# Altium footprint library SMDLibrary.PcbLib: 309 footprints (part 7 of 20)
Each footprint in its own frame and in the unit in brackets; x right, y up, seen from the top. Pads: shape width x height; smd on the part's side, far side on the other; paste and mask are expansions set on the pad; w line width, h text height; cw(c..) or ccw(c..) is an arc to the next point about the centre after c.
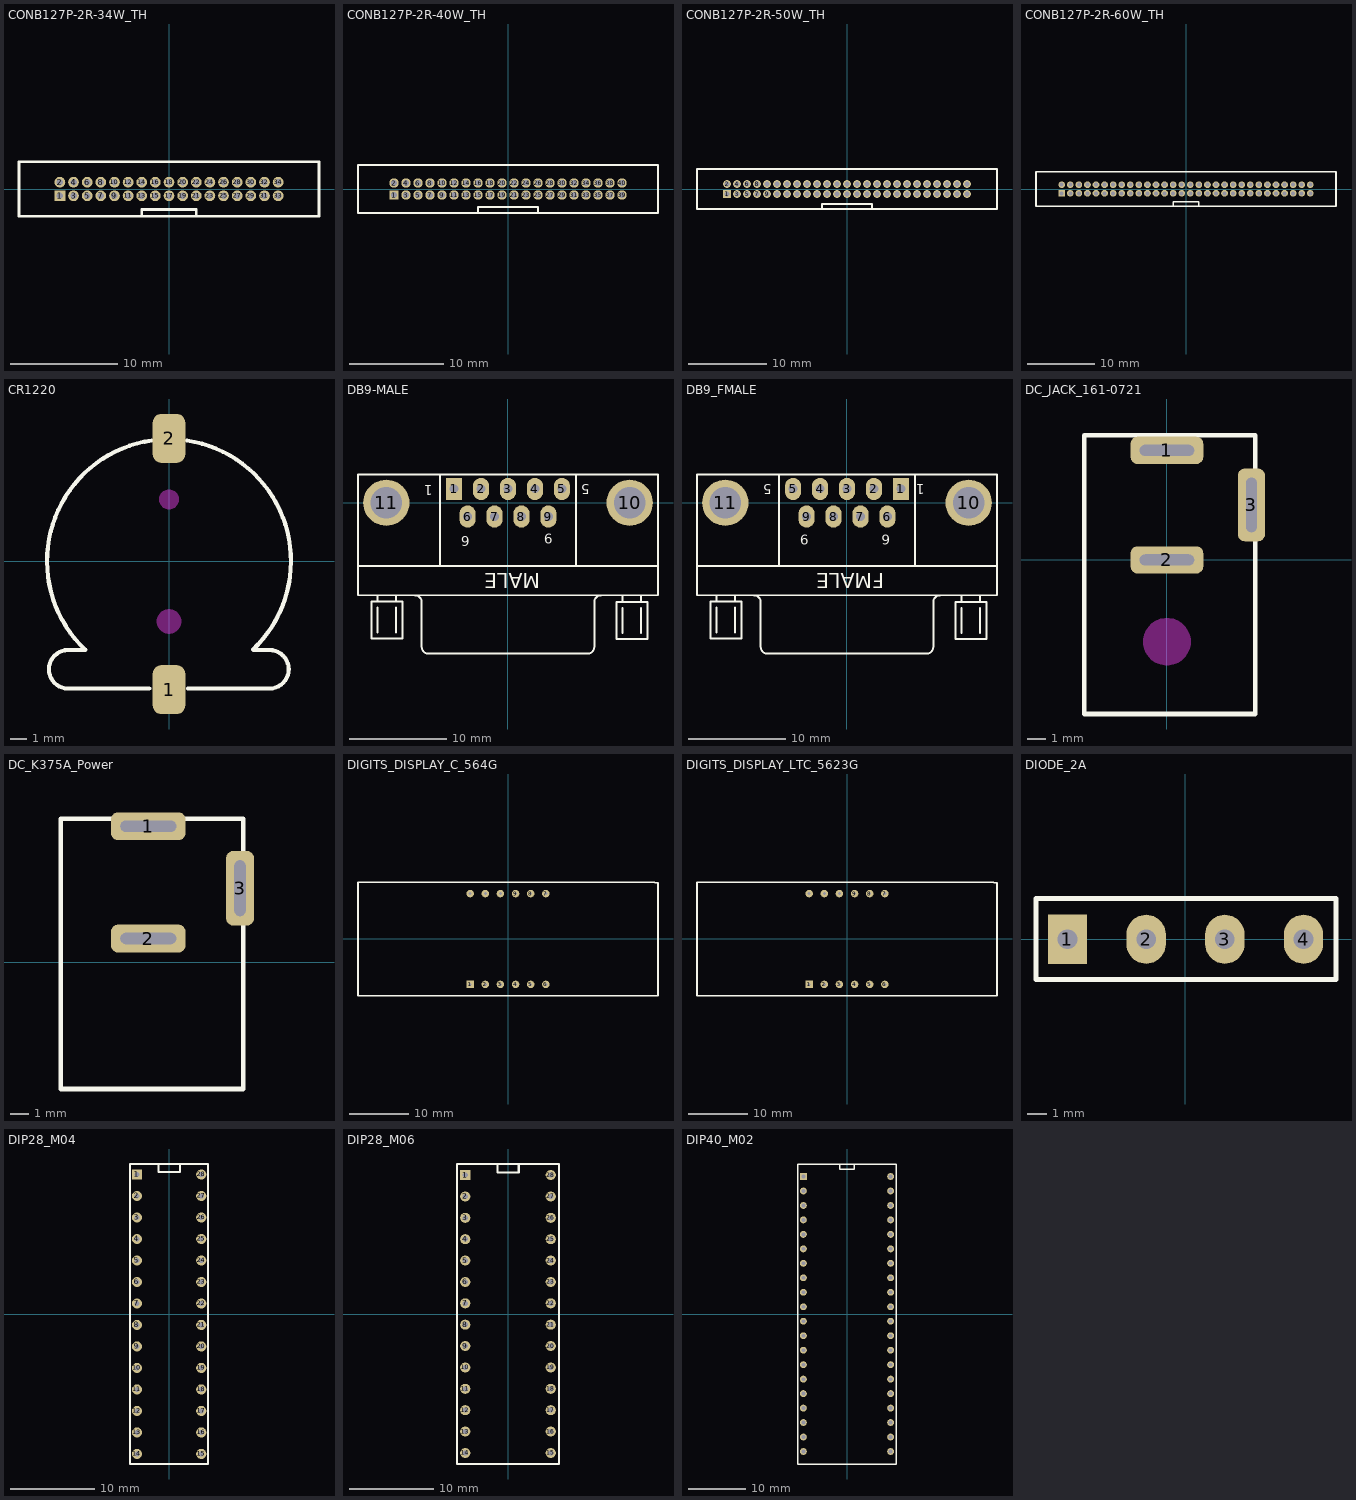
[diagram p6: the footprints below, top view; thin cyan lines are the x and y axes]

## CONB127P-2R-34W_TH [mm]
pads (34):
  rect 1x1 hole 0.6: 1(-10.16,-0.635)
  round 1 hole 0.6: 2(-10.16,0.635) 3(-8.89,-0.635) 4(-8.89,0.635) 5(-7.62,-0.635) 6(-7.62,0.635) 7(-6.35,-0.635) 8(-6.35,0.635) 9(-5.08,-0.635) 10(-5.08,0.635) 11(-3.81,-0.635) 12(-3.81,0.635) 13(-2.54,-0.635) 14(-2.54,0.635) 15(-1.27,-0.635) 16(-1.27,0.635) 17(0,-0.635) 18(0,0.635) 19(1.27,-0.635) 20(1.27,0.635) 21(2.54,-0.635) 22(2.54,0.635) 23(3.81,-0.635) 24(3.81,0.635) 25(5.08,-0.635) 26(5.08,0.635) 27(6.35,-0.635) 28(6.35,0.635) 29(7.62,-0.635) 30(7.62,0.635) 31(8.89,-0.635) 32(8.89,0.635) 33(10.16,-0.635) 34(10.16,0.635)
Top Overlay:
  lines w0.254: -2.54,-2.54 -2.54,-1.905 2.54,-1.905 2.54,-2.54 ; -13.97,-2.54 13.97,-2.54 13.97,2.54 -13.97,2.54 -13.97,-2.54
3D body "CONB127P-2R-34W_TH.STEP": height 5.4, standoff -2.1, extent -13.945,-2.65 13.945,2.55

## CONB127P-2R-40W_TH [mm]
pads (40):
  rect 1x1 hole 0.6: 1(-12.065,-0.635)
  round 1 hole 0.6: 2(-12.065,0.635) 3(-10.795,-0.635) 4(-10.795,0.635) 5(-9.525,-0.635) 6(-9.525,0.635) 7(-8.255,-0.635) 8(-8.255,0.635) 9(-6.985,-0.635) 10(-6.985,0.635) 11(-5.715,-0.635) 12(-5.715,0.635) 13(-4.445,-0.635) 14(-4.445,0.635) 15(-3.175,-0.635) 16(-3.175,0.635) 17(-1.905,-0.635) 18(-1.905,0.635) 19(-0.635,-0.635) 20(-0.635,0.635) 21(0.635,-0.635) 22(0.635,0.635) 23(1.905,-0.635) 24(1.905,0.635) 25(3.175,-0.635) 26(3.175,0.635) 27(4.445,-0.635) 28(4.445,0.635) 29(5.715,-0.635) 30(5.715,0.635) 31(6.985,-0.635) 32(6.985,0.635) 33(8.255,-0.635) 34(8.255,0.635) 35(9.525,-0.635) 36(9.525,0.635) 37(10.795,-0.635) 38(10.795,0.635) 39(12.065,-0.635) 40(12.065,0.635)
Top Overlay:
  lines w0.254: -3.175,-2.54 -3.175,-1.905 3.175,-1.905 3.175,-2.54 ; -15.875,-2.54 -15.875,2.54 15.875,2.54 15.875,-2.54 -15.875,-2.54
3D body "CONB127P-2R-40W_TH.STEP": height 5.4, standoff -2.1, extent -15.85,-2.65 15.85,2.55

## CONB127P-2R-50W_TH [mm]
pads (50):
  rect 1x1 hole 0.6: 1(-15.24,-0.635)
  round 1 hole 0.6: 2(-15.24,0.635) 3(-13.97,-0.635) 4(-13.97,0.635) 5(-12.7,-0.635) 6(-12.7,0.635) 7(-11.43,-0.635) 8(-11.43,0.635) 9(-10.16,-0.635) 10(-10.16,0.635) 11(-8.89,-0.635) 12(-8.89,0.635) 13(-7.62,-0.635) 14(-7.62,0.635) 15(-6.35,-0.635) 16(-6.35,0.635) 17(-5.08,-0.635) 18(-5.08,0.635) 19(-3.81,-0.635) 20(-3.81,0.635) 21(-2.54,-0.635) 22(-2.54,0.635) 23(-1.27,-0.635) 24(-1.27,0.635) 25(0,-0.635) 26(0,0.635) 27(1.27,-0.635) 28(1.27,0.635) 29(2.54,-0.635) 30(2.54,0.635) 31(3.81,-0.635) 32(3.81,0.635) 33(5.08,-0.635) 34(5.08,0.635) 35(6.35,-0.635) 36(6.35,0.635) 37(7.62,-0.635) 38(7.62,0.635) 39(8.89,-0.635) 40(8.89,0.635) 41(10.16,-0.635) 42(10.16,0.635) 43(11.43,-0.635) 44(11.43,0.635) 45(12.7,-0.635) 46(12.7,0.635) 47(13.97,-0.635) 48(13.97,0.635) 49(15.24,-0.635) 50(15.24,0.635)
Top Overlay:
  lines w0.254: -3.175,-2.54 -3.175,-1.905 3.175,-1.905 3.175,-2.54 ; -19.05,-2.54 -19.05,2.54 19.05,2.54 19.05,-2.54 -19.05,-2.54
3D body "CONB127P-2R-50W_TH.STEP": height 5.4, standoff -2.1, extent -19.025,-2.65 19.025,2.55

## CONB127P-2R-60W_TH [mm]
pads (60):
  rect 1x1 hole 0.6: 1(-18.415,-0.635)
  round 1 hole 0.6: 2(-18.415,0.635) 3(-17.145,-0.635) 4(-17.145,0.635) 5(-15.875,-0.635) 6(-15.875,0.635) 7(-14.605,-0.635) 8(-14.605,0.635) 9(-13.335,-0.635) 10(-13.335,0.635) 11(-12.065,-0.635) 12(-12.065,0.635) 13(-10.795,-0.635) 14(-10.795,0.635) 15(-9.525,-0.635) 16(-9.525,0.635) 17(-8.255,-0.635) 18(-8.255,0.635) 19(-6.985,-0.635) 20(-6.985,0.635) 21(-5.715,-0.635) 22(-5.715,0.635) 23(-4.445,-0.635) 24(-4.445,0.635) 25(-3.175,-0.635) 26(-3.175,0.635) 27(-1.905,-0.635) 28(-1.905,0.635) 29(-0.635,-0.635) 30(-0.635,0.635) 31(0.635,-0.635) 32(0.635,0.635) 33(1.905,-0.635) 34(1.905,0.635) 35(3.175,-0.635) 36(3.175,0.635) 37(4.445,-0.635) 38(4.445,0.635) 39(5.715,-0.635) 40(5.715,0.635) 41(6.985,-0.635) 42(6.985,0.635) 43(8.255,-0.635) 44(8.255,0.635) 45(9.525,-0.635) 46(9.525,0.635) 47(10.795,-0.635) 48(10.795,0.635) 49(12.065,-0.635) 50(12.065,0.635) 51(13.335,-0.635) 52(13.335,0.635) 53(14.605,-0.635) 54(14.605,0.635) 55(15.875,-0.635) 56(15.875,0.635) 57(17.145,-0.635) 58(17.145,0.635) 59(18.415,-0.635) 60(18.415,0.635)
Top Overlay:
  lines w0.254: -1.905,-2.54 -1.905,-1.905 1.905,-1.905 1.905,-2.54 ; -22.225,-2.54 -22.225,2.54 22.225,2.54 22.225,-2.54 -22.225,-2.54
3D body "CONB127P-2R-60W_TH.STEP": height 5.4, standoff -2.1, extent -22.2,-2.65 22.2,2.55

## CR1220 [mm]
pads (2):
  rrect50% 2x3 smd: 1(0,-7.9) 2(0,7.55)
Top Overlay:
  lines w0.254: -5.161,-5.463 -6.2,-5.463 ccw(c-6.2,-6.65) -6.2,-7.837 -1.213,-7.837 ; -5.15,-5.452 cw(c0,0) -1.057,7.425 ; 1.111,7.417 cw(c0,0) 5.164,-5.439 ; 1.162,-7.837 6.175,-7.837 ccw(c6.175,-6.65) 6.175,-5.463 5.187,-5.463
Keep-Out Layer:
  board cut-out: 0,3.2 -0.119,3.2 -0.34,3.291 -0.509,3.46 -0.6,3.681 -0.6,3.8 -0.6,3.919 -0.509,4.14 -0.34,4.309 -0.119,4.4 0,4.4 0.119,4.4 0.34,4.309 0.509,4.14 0.6,3.919 0.6,3.8 0.6,3.681 0.509,3.46 0.34,3.291 0.119,3.2
  board cut-out: -0.75,-3.7 -0.75,-3.774 -0.721,-3.919 -0.665,-4.055 -0.583,-4.178 -0.478,-4.283 -0.355,-4.365 -0.219,-4.421 -0.074,-4.45 0,-4.45 0.074,-4.45 0.219,-4.421 0.355,-4.365 0.478,-4.283 0.583,-4.178 0.665,-4.055 0.721,-3.919 0.75,-3.774 0.75,-3.7 0.75,-3.626 0.721,-3.481 0.665,-3.345 0.583,-3.222 0.478,-3.117 0.355,-3.035 0.219,-2.979 0.074,-2.95 0,-2.95 -0.074,-2.95 -0.219,-2.979 -0.355,-3.035 -0.478,-3.117 -0.583,-3.222 -0.665,-3.345 -0.721,-3.481 -0.75,-3.626
3D body "User Library-cr1220.STEP": height 4.04, standoff -0.9, extent -7.5,-9.425 7.497,9.075

## DB9-MALE [mil]
pads (11):
  rect 65x90 hole 35: 1(-218.11,55.91)
  oval 65x90 hole 35: 2(-109.05,55.91) 3(0,55.91) 4(109.06,55.91) 5(218.11,55.91) 6(-163.58,-55.91) 7(-54.53,-55.91) 8(54.53,-55.91) 9(163.58,-55.91)
  round 187.4 hole 128.35: 10(491.93,0) 11(-491.93,0)
Top Overlay:
  lines w7.87: -606.3,-255.91 606.3,-255.91 ; -376.38,-374.21 cw(c-376.38,-401.57) -349.02,-401.57 -349.02,-582.68 ; -348.82,-582.87 ccw(c-321.46,-582.87) -321.46,-610.24 321.46,-610.24 ccw(c321.46,-582.87) 348.82,-582.87 ; -275.59,-255.91 -275.59,114.17 ; 275.59,-255.91 275.59,114.17 ; 349.02,-582.68 349.02,-401.57 cw(c376.38,-401.57) 376.38,-374.21 ; -606.3,-374.02 -606.3,114.17 606.3,114.17 606.3,-374.02 -606.3,-374.02
  lines w8: -527,-524.02 -527,-424.02 ; -527,-399.02 -527,-374.02 ; -452,-524.02 -452,-424.02 ; -452,-399.02 -452,-374.02 ; 463,-526.02 463,-426.02 ; 463,-401.02 463,-376.02 ; 538,-526.02 538,-426.02 ; 538,-401.02 538,-376.02 ; -552,-549.02 -552,-399.02 -427,-399.02 -427,-549.02 -552,-549.02 ; 438,-551.02 438,-401.02 563,-401.02 563,-551.02 438,-551.02
  text "MALE" at 130,-285 h60
  text "1" at -305,70 h40
  text "5" at 330,75 h40
  text "9" at 180,-125 h40
  text "6" at -155,-135 h40
3D body "SW3dPS-9-PIN_DSUB.STEP": height 494.6, standoff -124.4, extent -610,-637 606,138

## DB9_FMALE [mil]
pads (11):
  rect 65x90 hole 35: 1(218.11,55.91)
  oval 65x90 hole 35: 2(109.06,55.91) 3(0,55.91) 4(-109.05,55.91) 5(-218.11,55.91) 6(163.58,-55.91) 7(54.53,-55.91) 8(-54.53,-55.91) 9(-163.58,-55.91)
  round 187.4 hole 128.35: 10(491.93,0) 11(-491.93,0)
Top Overlay:
  lines w7.87: -606.3,-255.91 606.3,-255.91 ; -376.38,-374.21 cw(c-376.38,-401.57) -349.02,-401.57 -349.02,-582.68 ; -348.82,-582.87 ccw(c-321.46,-582.87) -321.46,-610.24 321.46,-610.24 ccw(c321.46,-582.87) 348.82,-582.87 ; -275.59,-255.91 -275.59,114.17 ; 275.59,-255.91 275.59,114.17 ; 349.02,-582.68 349.02,-401.57 cw(c376.38,-401.57) 376.38,-374.21 ; -606.3,-374.02 606.3,-374.02 606.3,114.17 -606.3,114.17 -606.3,-374.02
  lines w8: -527,-524.02 -527,-424.02 ; -527,-399.02 -527,-374.02 ; -452,-524.02 -452,-424.02 ; -452,-399.02 -452,-374.02 ; 463,-526.02 463,-426.02 ; 463,-401.02 463,-376.02 ; 538,-526.02 538,-426.02 ; 538,-401.02 538,-376.02 ; -552,-549.02 -427,-549.02 -427,-399.02 -552,-399.02 -552,-549.02 ; 438,-551.02 563,-551.02 563,-401.02 438,-401.02 438,-551.02
  text "FMALE" at 150,-285 h60
  text "6" at 175,-130 h40
  text "9" at -155,-130 h40
  text "5" at -305,75 h40
  text "1" at 315,75 h40
3D body "SW3dPS-9-PIN_DSUB-1.STEP": height 494.6, standoff -124.4, extent -608.5,-613 604.5,138

## DC_JACK_161-0721 [mm]
pads (3):
  rrect50% 4x1.5 hole 0.6 slot 3 at 0 deg: 1(0,6.025) 2(0,0)
  rrect50% 1.5x4 hole 0.6 slot 3 at 90 deg: 3(4.65,3.025)
Top Overlay:
  lines w0.254: -4.55,-8.475 -4.55,6.85 4.85,6.85 4.85,-8.475 -4.55,-8.475
Keep-Out Layer:
  board cut-out: -1.3,-4.5 -1.3,-4.628 -1.25,-4.879 -1.152,-5.116 -1.01,-5.329 -0.829,-5.51 -0.616,-5.652 -0.379,-5.75 -0.128,-5.8 0,-5.8 0.128,-5.8 0.379,-5.75 0.616,-5.652 0.829,-5.51 1.01,-5.329 1.152,-5.116 1.25,-4.879 1.3,-4.628 1.3,-4.5 1.3,-4.372 1.25,-4.121 1.152,-3.884 1.01,-3.671 0.829,-3.49 0.616,-3.348 0.379,-3.25 0.128,-3.2 0,-3.2 -0.128,-3.2 -0.379,-3.25 -0.616,-3.348 -0.829,-3.49 -1.01,-3.671 -1.152,-3.884 -1.25,-4.121 -1.3,-4.372
3D body "User Library-Kobiconn_Lockable_DC_jack_161-0721-EX.STEP": height 11.5, standoff -3, extent -4.528,-8.5 4.828,6.8

## DC_K375A_Power [mm]
pads (3):
  rrect50% 4x1.5 hole 0.6 slot 3 at 0 deg: 1(-13,7.3) 2(-13,1.275)
  rrect50% 1.5x4 hole 0.6 slot 3 at 90 deg: 3(-8.075,3.975)
Top Overlay:
  lines w0.254: -17.7,-6.8 -7.9,-6.8 -7.9,7.7 -17.7,7.7 -17.7,-6.8
3D body "User Library-K375A -PCM DC Power Jack 2mm Pin.sldprt": height 11, standoff -5.1, extent -17.7,-6.8 -7.9,7.7

## DIGITS_DISPLAY_C_564G [mm]
pads (12):
  rect 1.25x1.25 hole 0.51: 1(-6.35,-7.62)
  round 1.25 hole 0.51: 2(-3.81,-7.62) 3(-1.27,-7.62) 4(1.27,-7.62) 5(3.81,-7.62) 6(6.35,-7.62) 7(6.35,7.62) 8(3.81,7.62) 9(1.27,7.62) 10(-1.27,7.62) 11(-3.81,7.62) 12(-6.35,7.62)
Top Overlay:
  lines w0.254: -25.2,-9.5 25.2,-9.5 25.2,9.489 24.666,9.489 24.666,9.5 -23.385,9.5 -25.2,9.5 -25.2,-9.5
3D body "User Library-C-564 (7 segment 4 digit LED display).STEP": height 8, standoff -6.2, extent -25.2,-9.5 25.2,9.5

## DIGITS_DISPLAY_LTC_5623G [mm]
pads (12):
  rect 1.25x1.25 hole 0.51: 1(-6.35,-7.62)
  round 1.25 hole 0.51: 2(-3.81,-7.62) 3(-1.27,-7.62) 4(1.27,-7.62) 5(3.81,-7.62) 6(6.35,-7.62) 7(6.35,7.62) 8(3.81,7.62) 9(1.27,7.62) 10(-1.27,7.62) 11(-3.81,7.62) 12(-6.35,7.62)
Top Overlay:
  lines w0.254: -25.2,-9.5 -25.2,9.5 -23.385,9.5 24.666,9.5 24.666,9.489 25.2,9.489 25.2,-9.5 -25.2,-9.5
3D body "User Library-LTC-5623G.STEP": height 8, standoff -7.8, extent -25.15,-9.5 25.15,9.5

## DIODE_2A [mm]
pads (4):
  rect 2x2.5 hole 1: 1(-5.975,0)
  oval 2x2.5 hole 1: 2(-1.975,0) 3(2.025,0) 4(6.025,0)
Top Overlay:
  lines w0.254: -7.575,-2.05 -7.575,2.075 7.675,2.075 7.675,-2.05 -7.575,-2.05
3D body "Diode_Bridge.STEP": height 11, standoff -9, extent -7.475,-1.9 7.525,1.9

## DIP28_M04 [mm]
pads (28):
  rect 1.2x1.2 hole 0.6: 1(-3.8,16.51)
  round 1.2 hole 0.6: 2(-3.8,13.97) 3(-3.8,11.43) 4(-3.8,8.89) 5(-3.8,6.35) 6(-3.8,3.81) 7(-3.8,1.27) 8(-3.8,-1.27) 9(-3.8,-3.81) 10(-3.8,-6.35) 11(-3.8,-8.89) 12(-3.8,-11.43) 13(-3.8,-13.97) 14(-3.8,-16.51) 15(3.8,-16.51) 16(3.8,-13.97) 17(3.8,-11.43) 18(3.8,-8.89) 19(3.8,-6.35) 20(3.8,-3.81) 21(3.8,-1.27) 22(3.8,1.27) 23(3.8,3.81) 24(3.8,6.35) 25(3.8,8.89) 26(3.8,11.43) 27(3.8,13.97) 28(3.8,16.51)
Top Overlay:
  lines w0.254: -1.263,17.725 -1.263,16.8 1.277,16.8 1.277,17.725 ; -4.625,-17.7 -4.625,17.75 4.6,17.75 4.6,-17.7 -4.625,-17.7
3D body "User Library-DIP-28P-M04.STEP": height 5.2, standoff -3, extent -3.895,-17.7 3.975,17.7

## DIP28_M06 [mm]
pads (28):
  rect 1.2x1.2 hole 0.6: 1(-5.08,16.51)
  round 1.2 hole 0.6: 2(-5.08,13.97) 3(-5.08,11.43) 4(-5.08,8.89) 5(-5.08,6.35) 6(-5.08,3.81) 7(-5.08,1.27) 8(-5.08,-1.27) 9(-5.08,-3.81) 10(-5.08,-6.35) 11(-5.08,-8.89) 12(-5.08,-11.43) 13(-5.08,-13.97) 14(-5.08,-16.51) 15(5.08,-16.51) 16(5.08,-13.97) 17(5.08,-11.43) 18(5.08,-8.89) 19(5.08,-6.35) 20(5.08,-3.81) 21(5.08,-1.27) 22(5.08,1.27) 23(5.08,3.81) 24(5.08,6.35) 25(5.08,8.89) 26(5.08,11.43) 27(5.08,13.97) 28(5.08,16.51)
Top Overlay:
  lines w0.254: -1.263,17.725 -1.263,16.8 1.277,16.8 1.277,17.725 ; -6.05,-17.825 6.05,-17.825 6.05,17.825 -6.05,17.825 -6.05,-17.825
3D body "User Library-DIP-28P-M06.STEP": height 5.2, standoff -3, extent -5.21,-17.7 5.2,17.7

## DIP40_M02 [mm]
pads (40):
  rect 1.2x1.2 hole 0.65: 1(-7.65,24.13)
  round 1.2 hole 0.65: 2(-7.65,21.59) 3(-7.65,19.05) 4(-7.65,16.51) 5(-7.65,13.97) 6(-7.65,11.43) 7(-7.65,8.89) 8(-7.65,6.35) 9(-7.65,3.81) 10(-7.65,1.27) 11(-7.65,-1.27) 12(-7.65,-3.81) 13(-7.65,-6.35) 14(-7.65,-8.89) 15(-7.65,-11.43) 16(-7.65,-13.97) 17(-7.65,-16.51) 18(-7.65,-19.05) 19(-7.65,-21.59) 20(-7.65,-24.13) 21(7.65,-24.13) 22(7.65,-21.59) 23(7.65,-19.05) 24(7.65,-16.51) 25(7.65,-13.97) 26(7.65,-11.43) 27(7.65,-8.89) 28(7.65,-6.35) 29(7.65,-3.81) 30(7.65,-1.27) 31(7.65,1.27) 32(7.65,3.81) 33(7.65,6.35) 34(7.65,8.89) 35(7.65,11.43) 36(7.65,13.97) 37(7.65,16.51) 38(7.65,19.05) 39(7.65,21.59) 40(7.65,24.13)
Top Overlay:
  lines w0.254: -1.27,26.325 -1.27,25.4 1.27,25.4 1.27,26.325 ; -8.625,-26.325 8.625,-26.325 8.625,25.65 8.625,26.325 -8.625,26.325 -8.625,-26.325
3D body "User Library-DIP-40P-M02.STEP": height 5, standoff -3, extent -7.725,-26.205 7.765,26.195

## DO-35 [mm]
3D body "DO-35 Diode Horizontal.stp": height 2.02, standoff -3.04, extent -5.36,-0.925 5.36,0.925